# Altium footprint library ICs And Semiconductors THD.PcbLib: 350 footprints (part 22 of 22)
Each footprint in its own frame and in the unit in brackets; x right, y up, seen from the top. Pads: shape width x height; smd on the part's side, far side on the other; paste and mask are expansions set on the pad; w line width, h text height; cw(c..) or ccw(c..) is an arc to the next point about the centre after c.
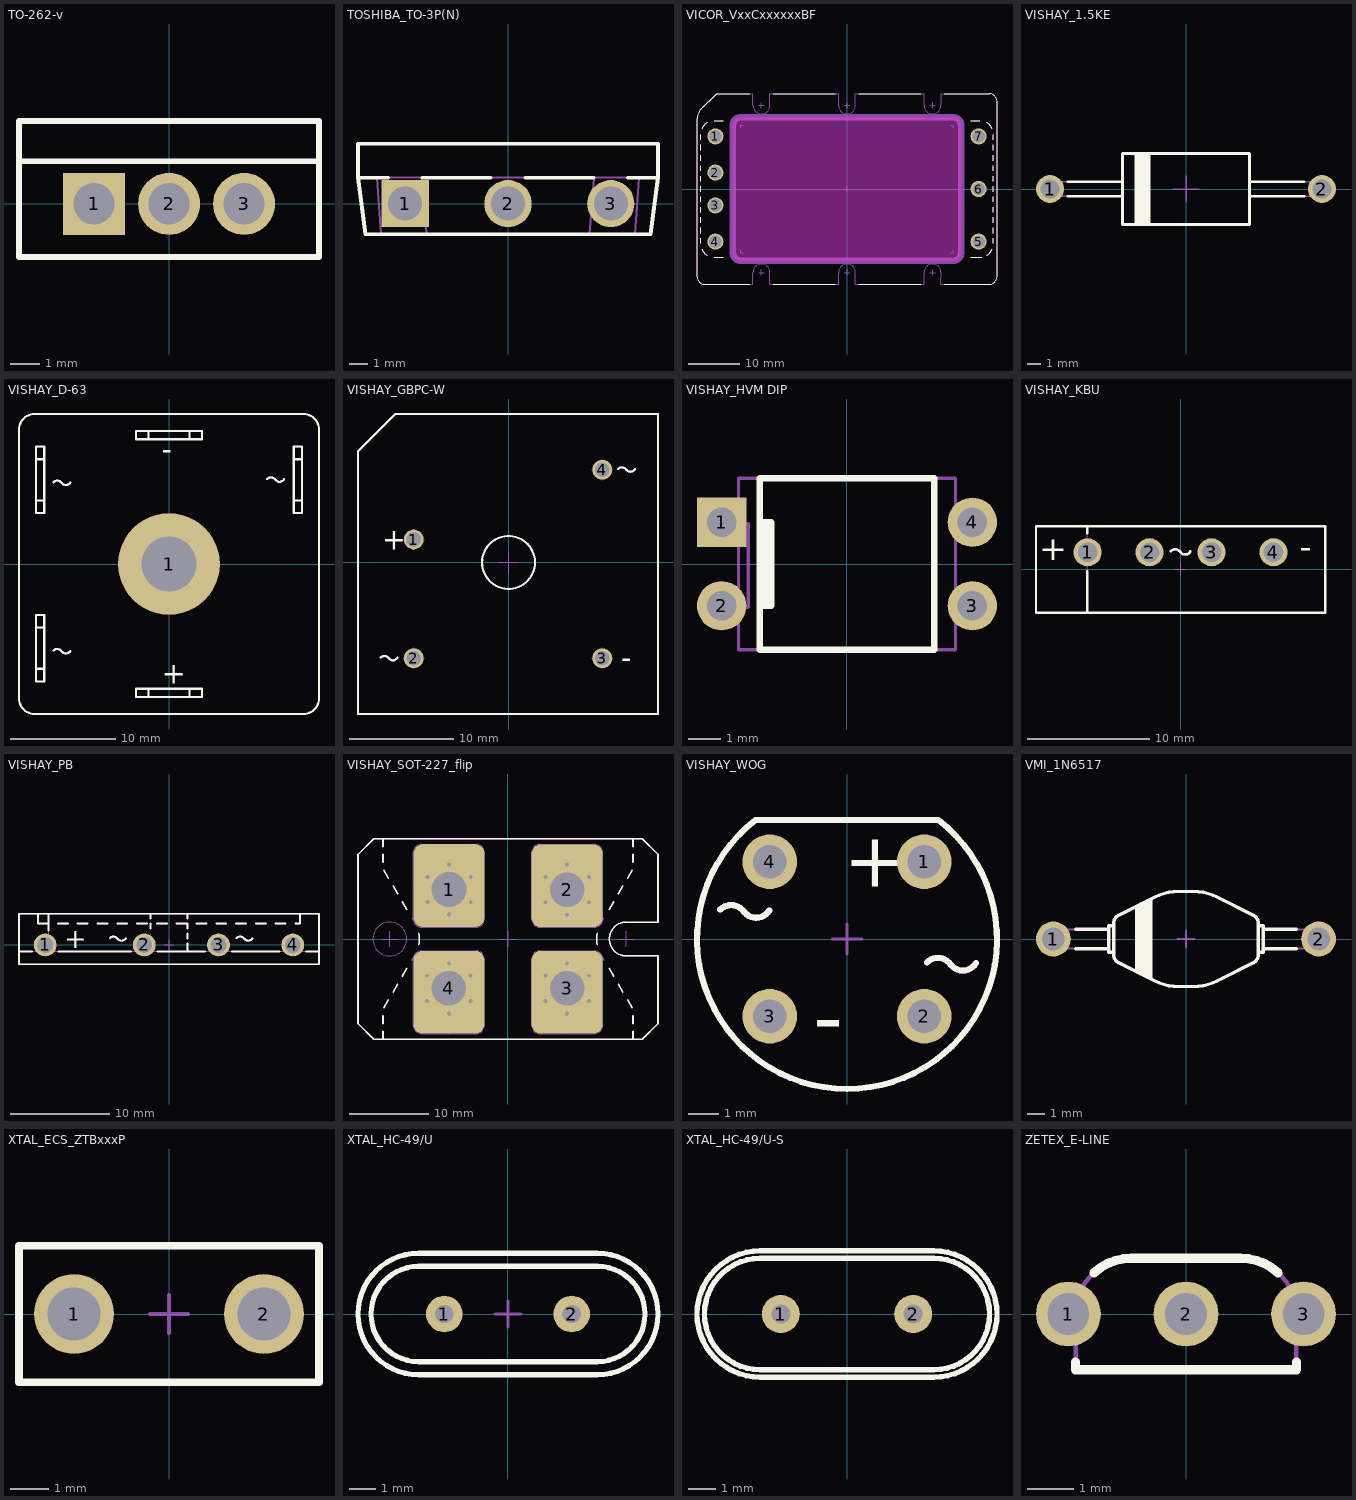
[diagram p21: the footprints below, top view; thin cyan lines are the x and y axes]

## TO-262-v [mm] "TO-262 3-Terminal - Vertical Mount"
height 15.01
pads (3):
  rect 2.1x2.1 hole 1.4: 1(-2.54,0)
  round 2.1 hole 1.4: 2(0,0) 3(2.54,0)
Top Overlay:
  lines w0.2: -5.082,1.445 5.078,1.445 ; -5.082,-1.795 5.078,-1.795 5.078,2.805 -5.082,2.805 -5.082,-1.795
Notvisible:
  lines w0.1: -3.04,0 -2.54,0 ; -2.54,-0.5 -2.54,0 ; -2.54,0.5 -2.54,0 ; -2.04,0 -2.54,0 ; -0.5,0 0,0 ; 0,-0.5 0,0 ; 0,0.5 0,0 ; 0.5,0 0,0 ; 2.04,0 2.54,0 ; 2.54,-0.5 2.54,0 ; 2.54,0.5 2.54,0 ; 3.04,0 2.54,0
Mechanical 14:
  lines w0.1: -5.082,1.445 5.078,1.445 ; -5.082,-1.795 5.078,-1.795 5.078,2.805 -5.082,2.805 -5.082,-1.795
3D body "TO-262-V.stp": height 15.3, standoff -3.6, extent -5.082,-1.795 5.078,2.805

## TOSHIBA_TO-3P(N) [mm] "TOSHIBA TO-3P(N) 3-Terminal - Vertical Mount"
height 25.5
pads (3):
  rect 2.5x2.5 hole 1.8: 1(-5.45,0)
  round 2.5 hole 1.8: 2(0,0) 3(5.45,0)
Top Overlay:
  lines w0.2: -6.362,1.375 -7.95,1.375 ; -4.538,1.375 -0.912,1.375 ; 0.912,1.375 4.538,1.375 ; 6.362,1.375 7.95,1.375 ; -7.95,1.375 -7.95,3.175 0,3.175 7.95,3.175 7.95,1.375 ; -7.95,1.375 -7.55,-1.625 0,-1.625 7.55,-1.625 7.95,1.375
Notvisible:
  lines w0.1: -6.45,0 -5.45,0 ; -5.45,-1 -5.45,0 ; -5.45,1 -5.45,0 ; -4.45,0 -5.45,0 ; -1,0 0,0 ; 0,-1 0,0 ; 0,1 0,0 ; 1,0 0,0 ; 4.45,0 5.45,0 ; 5.45,-1 5.45,0 ; 5.45,1 5.45,0 ; 6.45,0 5.45,0
Mechanical 14:
  lines w0.1: -6.95,1.375 -6.724,-1.625 ; -4.55,1.375 -4.324,-1.625 ; 4.324,-1.625 4.55,1.375 ; 6.724,-1.625 6.95,1.375 ; -7.95,1.375 -7.95,3.175 0,3.175 7.95,3.175 7.95,1.375 ; -7.95,1.375 -7.55,-1.625 0,-1.625 7.55,-1.625 7.95,1.375 ; -7.95,1.375 0,1.375 7.95,1.375
3D body "TOSHIBA_TO-3P(N)_v.stp": height 25.5, standoff -3.8, extent -7.95,-1.625 7.95,3.175

## VICOR_VxxCxxxxxxBF [mm] "VICOR  Micro DC-DC Converters, Short Pin RoHS, Slotted Baseplate"
height 12.7
pads (7):
  round 3.1 hole 2.4: 1(-25.4,10.16) 2(-25.4,3.175) 3(-25.4,-3.175) 4(-25.4,-10.16) 5(25.4,-10.16) 6(25.4,0) 7(25.4,10.16)
Top Overlay:
  lines w0.2: -28.194,-10.517 -28.194,-9.5 ; -28.194,-8.5 -28.194,-7.5 ; -28.194,-6.5 -28.194,-5.5 ; -28.194,-4.5 -28.194,-3.5 ; -28.194,-2.5 -28.194,-1.5 ; -28.194,-0.5 -28.194,0.5 ; -28.194,1.5 -28.194,2.5 ; -28.194,3.5 -28.194,4.5 ; -28.194,5.5 -28.194,6.5 ; -28.194,7.5 -28.194,8.5 ; -28.194,9.5 -28.194,10.517 ; -28,-11.642 ccw(c-25.655,-10.669) -27,-12.822 ; -28,11.642 cw(c-25.655,10.669) -27,12.822 ; -25.655,-13.208 -23.911,-13.208 ; -25.655,13.208 -23.911,13.208 ; -18.82,-18.415 -27.432,-18.415 cw(c-27.432,-16.891) -28.956,-16.891 -28.956,13.553 cw(c-26.416,13.553) -28.212,15.349 -25.146,18.415 -18.82,18.415 ; -14.2,-18.415 -2.31,-18.415 ; -14.2,18.415 -2.31,18.415 ; 2.31,-18.415 14.2,-18.415 ; 2.31,18.415 14.2,18.415 ; 18.82,-18.415 27.432,-18.415 ccw(c27.432,-16.891) 28.956,-16.891 28.956,16.891 ccw(c27.432,16.891) 27.432,18.415 18.82,18.415 ; 23.911,-13.208 25.655,-13.208 ccw(c25.655,-10.669) 26,-13.184 ; 23.911,13.208 25.655,13.208 ; 27,-12.822 ccw(c25.655,-10.669) 28,-11.642 ; 27,12.822 cw(c25.655,10.669) 28,11.642 ; 28.194,-10.517 28.194,-9.5 ; 28.194,-8.5 28.194,-7.5 ; 28.194,-6.5 28.194,-5.5 ; 28.194,-4.5 28.194,-3.5 ; 28.194,-2.5 28.194,-1.5 ; 28.194,-0.5 28.194,0.5 ; 28.194,1.5 28.194,2.5 ; 28.194,3.5 28.194,4.5 ; 28.194,5.5 28.194,6.5 ; 28.194,7.5 28.194,8.5 ; 28.194,9.5 28.194,10.517
Keep-Out Layer:
  board cut-out: -20.52,-13.836 -20.668,-13.836 -20.958,-13.778 -21.231,-13.665 -21.476,-13.501 -21.685,-13.292 -21.849,-13.046 -21.962,-12.773 -22.02,-12.483 -22.02,-12.336 -22.02,12.35 -22.02,12.498 -21.962,12.788 -21.849,13.061 -21.685,13.306 -21.476,13.515 -21.231,13.68 -20.958,13.793 -20.668,13.85 -20.52,13.85 20.52,13.85 20.668,13.85 20.958,13.793 21.231,13.68 21.476,13.515 21.685,13.306 21.849,13.061 21.962,12.788 22.02,12.498 22.02,12.35 22.02,-12.336 22.02,-12.483 21.962,-12.773 21.849,-13.046 21.685,-13.292 21.476,-13.501 21.231,-13.665 20.958,-13.778 20.668,-13.836 20.52,-13.836
Mechanical 1:
  lines w1.27: -22.02,-12.343 ccw(c-20.52,-12.343) -20.52,-13.843 20.52,-13.843 ccw(c20.52,-12.343) 22.02,-12.343 22.02,12.343 ccw(c20.52,12.343) 20.52,13.843 -20.52,13.843 ccw(c-20.52,12.343) -22.02,12.343 -22.02,-12.343
Notvisible:
  lines w0.1: -25.9,-10.16 -25.4,-10.16 ; -25.9,-3.175 -25.4,-3.175 ; -25.9,3.175 -25.4,3.175 ; -25.9,10.16 -25.4,10.16 ; -25.4,-10.66 -25.4,-10.16 ; -25.4,-9.66 -25.4,-10.16 ; -25.4,-3.675 -25.4,-3.175 ; -25.4,-2.675 -25.4,-3.175 ; -25.4,2.675 -25.4,3.175 ; -25.4,3.675 -25.4,3.175 ; -25.4,9.66 -25.4,10.16 ; -25.4,10.66 -25.4,10.16 ; -24.9,-10.16 -25.4,-10.16 ; -24.9,-3.175 -25.4,-3.175 ; -24.9,3.175 -25.4,3.175 ; -24.9,10.16 -25.4,10.16 ; -20.52,-11.843 -20.52,-12.343 -20.02,-12.343 ; -20.52,11.843 -20.52,12.343 -20.02,12.343 ; -17.01,-16.129 -16.51,-16.129 ; -17.01,16.129 -16.51,16.129 ; -16.51,-16.629 -16.51,-16.129 ; -16.51,-15.629 -16.51,-16.129 ; -16.51,15.629 -16.51,16.129 ; -16.51,16.629 -16.51,16.129 ; -16.01,-16.129 -16.51,-16.129 ; -16.01,16.129 -16.51,16.129 ; -0.5,-16.129 0,-16.129 ; -0.5,0 0,0 ; -0.5,16.129 0,16.129 ; 0,-16.629 0,-16.129 ; 0,-15.629 0,-16.129 ; 0,-0.5 0,0 ; 0,0.5 0,0 ; 0,15.629 0,16.129 ; 0,16.629 0,16.129 ; 0.5,-16.129 0,-16.129 ; 0.5,0 0,0 ; 0.5,16.129 0,16.129 ; 16.01,-16.129 16.51,-16.129 ; 16.01,16.129 16.51,16.129 ; 16.51,-16.629 16.51,-16.129 ; 16.51,-15.629 16.51,-16.129 ; 16.51,15.629 16.51,16.129 ; 16.51,16.629 16.51,16.129 ; 17.01,-16.129 16.51,-16.129 ; 17.01,16.129 16.51,16.129 ; 20.02,-12.343 20.52,-12.343 20.52,-11.843 ; 20.02,12.343 20.52,12.343 20.52,11.843 ; 24.9,-10.16 25.4,-10.16 ; 24.9,0 25.4,0 ; 24.9,10.16 25.4,10.16 ; 25.4,-10.66 25.4,-10.16 ; 25.4,-9.66 25.4,-10.16 ; 25.4,-0.5 25.4,0 ; 25.4,0.5 25.4,0 ; 25.4,9.66 25.4,10.16 ; 25.4,10.66 25.4,10.16 ; 25.9,-10.16 25.4,-10.16 ; 25.9,0 25.4,0 ; 25.9,10.16 25.4,10.16 ; -22.02,-12.343 ccw(c-20.52,-12.343) -20.52,-13.843 20.52,-13.843 ccw(c20.52,-12.343) 22.02,-12.343 22.02,12.343 ccw(c20.52,12.343) 20.52,13.843 -20.52,13.843 ccw(c-20.52,12.343) -22.02,12.343 -22.02,-12.343
Mechanical 14:
  lines w0.1: -28.956,-16.891 -28.956,13.553 ; -28.212,15.349 -25.146,18.415 -18.148,18.415 -18.148,16.129 ccw(c-16.51,16.129) -14.872,16.129 -14.872,18.415 -1.638,18.415 -1.638,16.129 ccw(c0,16.129) 1.638,16.129 1.638,18.415 14.872,18.415 14.872,16.129 ccw(c16.51,16.129) 18.148,16.129 18.148,18.415 27.432,18.415 ; -28.194,-10.517 -28.194,-9.5 ; -28.194,-8.5 -28.194,-7.5 ; -28.194,-6.5 -28.194,-5.5 ; -28.194,-4.5 -28.194,-3.5 ; -28.194,-2.5 -28.194,-1.5 ; -28.194,-0.5 -28.194,0.5 ; -28.194,1.5 -28.194,2.5 ; -28.194,3.5 -28.194,4.5 ; -28.194,5.5 -28.194,6.5 ; -28.194,7.5 -28.194,8.5 ; -28.194,9.5 -28.194,10.517 ; -28,-11.642 ccw(c-25.655,-10.669) -27,-12.822 ; -28,11.642 cw(c-25.655,10.669) -27,12.822 ; -27.432,-18.415 -18.148,-18.415 -18.148,-16.129 cw(c-16.51,-16.129) -14.872,-16.129 -14.872,-18.415 -1.638,-18.415 -1.638,-16.129 cw(c0,-16.129) 1.638,-16.129 1.638,-18.415 14.872,-18.415 14.872,-16.129 cw(c16.51,-16.129) 18.148,-16.129 18.134,-18.415 27.432,-18.415 ; -25.655,-13.208 -23.911,-13.208 ; -25.655,13.208 -23.911,13.208 ; 23.911,-13.208 25.655,-13.208 ccw(c25.655,-10.669) 26,-13.184 ; 23.911,13.208 25.655,13.208 ; 27,-12.822 ccw(c25.655,-10.669) 28,-11.642 ; 27,12.822 cw(c25.655,10.669) 28,11.642 ; 28.194,-10.517 28.194,-9.5 ; 28.194,-8.5 28.194,-7.5 ; 28.194,-6.5 28.194,-5.5 ; 28.194,-4.5 28.194,-3.5 ; 28.194,-2.5 28.194,-1.5 ; 28.194,-0.5 28.194,0.5 ; 28.194,1.5 28.194,2.5 ; 28.194,3.5 28.194,4.5 ; 28.194,5.5 28.194,6.5 ; 28.194,7.5 28.194,8.5 ; 28.194,9.5 28.194,10.517 ; 28.956,-16.891 28.956,16.891
3D body "VICOR_VxxCxxxxxxBF.stp": height 10.9, standoff -2.88, extent -28.956,-18.415 28.956,18.415

## VISHAY_1.5KE [mm] "VISHAY 1.5KE Case Style, Diode, Axial; Lead Spacing 20.32mm, Lead Dia. 1.07mm, Body Length 9.5mm, Body Dia. 5.3mm"
height 5.3
pads (2):
  round 2.1 hole 1.4: 1(-10.16,0) 2(10.16,0)
Top Overlay:
  lines w0.2: -8.812,-0.535 -4.75,-0.535 ; -8.812,0.535 -4.75,0.535 ; -3.75,-2.65 -3.75,2.65 ; -3.55,-2.65 -3.55,2.65 ; -3.35,-2.65 -3.35,2.65 ; -3.15,-2.65 -3.15,2.65 ; -2.95,-2.65 -2.95,2.65 ; -2.75,-2.65 -2.75,2.65 ; 4.75,-0.535 8.812,-0.535 ; 4.75,0.535 8.812,0.535 ; -4.75,-2.65 -4.75,2.65 4.75,2.65 4.75,-2.65 -4.75,-2.65
Notvisible:
  lines w0.1: -11.16,0 -10.16,0 ; -10.16,-1 -10.16,0 ; -10.16,1 -10.16,0 ; -9.16,0 -10.16,0 ; -1,0 0,0 ; 0,-1 0,0 ; 0,1 0,0 ; 1,0 0,0 ; 9.16,0 10.16,0 ; 10.16,-1 10.16,0 ; 10.16,1 10.16,0 ; 11.16,0 10.16,0
Mechanical 14:
  lines w0.1: -4.75,-0.535 -10.16,-0.535 cw(c-10.16,0) -10.16,0.535 -4.75,0.535 ; -3.75,-2.65 -3.75,2.65 ; -3.55,-2.65 -3.55,2.65 ; -3.35,-2.65 -3.35,2.65 ; -3.15,-2.65 -3.15,2.65 ; -2.95,-2.65 -2.95,2.65 ; -2.75,-2.65 -2.75,2.65 ; 4.75,-0.535 10.16,-0.535 ccw(c10.16,0) 10.16,0.535 4.75,0.535 ; -4.75,-2.65 -4.75,2.65 4.75,2.65 4.75,-2.65 -4.75,-2.65
3D body "VISHAY_1.5KE.stp": height 5.3, standoff -3.8, extent -10.695,-2.65 10.695,2.65

## VISHAY_D-63 [mm] "Three Phase Bridge Bridge, Body 28.5mm x 28.5mm"
height 10
pads (1):
  round 9.65 hole 5.2: 1(0,0)
Top Overlay:
  lines w0.2: -12.65,-9.95 -11.85,-9.95 ; -12.65,-6.05 -11.85,-6.05 ; -12.65,6.05 -11.85,6.05 ; -12.65,9.95 -11.85,9.95 ; -10.975,-8.232 cw(c-10.615,-8.579) -10.2,-8.3 ; -10.975,7.768 cw(c-10.615,7.421) -10.2,7.7 ; -10.175,-8.32 ccw(c-9.794,-7.996) -9.365,-8.254 ; -10.175,7.68 ccw(c-9.794,8.004) -9.365,7.746 ; -1.95,-12.65 -1.95,-11.85 ; -1.95,11.85 -1.95,12.65 ; 1.95,-12.65 1.95,-11.85 ; 1.95,11.85 1.95,12.65 ; 9.325,8.068 cw(c9.685,7.721) 10.1,8 ; 10.125,7.98 ccw(c10.506,8.304) 10.935,8.046 ; 11.85,6.05 12.65,6.05 ; 11.85,9.95 12.65,9.95 ; -14.25,-12.75 ccw(c-12.75,-12.75) -12.75,-14.25 12.75,-14.25 ccw(c12.75,-12.75) 14.25,-12.75 14.25,12.75 ccw(c12.75,12.75) 12.75,14.25 -12.75,14.25 ccw(c-12.75,12.75) -14.25,12.75 -14.25,-12.75 ; -12.65,-11.15 -12.65,-4.85 -11.85,-4.85 -11.85,-11.15 -12.65,-11.15 ; -12.65,4.85 -12.65,11.15 -11.85,11.15 -11.85,4.85 -12.65,4.85 ; -3.15,-12.65 3.15,-12.65 3.15,-11.85 -3.15,-11.85 -3.15,-12.65 ; -3.15,11.85 3.15,11.85 3.15,12.65 -3.15,12.65 -3.15,11.85 ; 11.85,4.85 11.85,11.15 12.65,11.15 12.65,4.85 11.85,4.85
  text "+" at -0.7,-11.4 h2
  text "-" at -0.7,9.9 h2
Notvisible:
  lines w0.1: -1,0 0,0 ; 0,-1 0,0 ; 0,1 0,0 ; 1,0 0,0
Mechanical 14:
  circle w0.1: c0,0 r2.6
  lines w0.1: -14.25,-12.75 ccw(c-12.75,-12.75) -12.75,-14.25 ; -14.25,-12.75 ccw(c-12.75,-12.75) -12.75,-14.25 ; -14.25,-12.75 ccw(c-12.75,-12.75) -12.75,-14.25 ; -14.25,-12.75 -14.25,12.75 ; -14.25,-12.75 -14.25,12.75 ; -14.25,-12.75 -14.25,12.75 ; -14.25,12.75 cw(c-12.75,12.75) -12.75,14.25 ; -14.25,12.75 cw(c-12.75,12.75) -12.75,14.25 ; -14.25,12.75 cw(c-12.75,12.75) -12.75,14.25 ; -12.75,-14.25 12.75,-14.25 ; -12.75,-14.25 12.75,-14.25 ; -12.75,-14.25 12.75,-14.25 ; -12.75,14.25 12.75,14.25 ; -12.75,14.25 12.75,14.25 ; -12.75,14.25 12.75,14.25 ; -12.65,-11.15 -12.65,-4.85 ; -12.65,-11.15 -11.85,-11.15 ; -12.65,-11.15 -11.85,-11.15 ; -12.65,-11.15 -12.65,-4.85 ; -12.65,-11.15 -12.65,-4.85 ; -12.65,-11.15 -11.85,-11.15 ; -12.65,-9.95 -11.85,-9.95 ; -12.65,-9.95 -11.85,-9.95 ; -12.65,-9.95 -11.85,-9.95 ; -12.65,-6.05 -11.85,-6.05 ; -12.65,-6.05 -11.85,-6.05 ; -12.65,-6.05 -11.85,-6.05 ; -12.65,-4.85 -11.85,-4.85 ; -12.65,-4.85 -11.85,-4.85 ; -12.65,-4.85 -11.85,-4.85 ; -12.65,4.85 -12.65,11.15 ; -12.65,4.85 -11.85,4.85 ; -12.65,4.85 -11.85,4.85 ; -12.65,4.85 -12.65,11.15 ; -12.65,4.85 -12.65,11.15 ; -12.65,4.85 -11.85,4.85 ; -12.65,6.05 -11.85,6.05 ; -12.65,6.05 -11.85,6.05 ; -12.65,6.05 -11.85,6.05 ; -12.65,9.95 -11.85,9.95 ; -12.65,9.95 -11.85,9.95 ; -12.65,9.95 -11.85,9.95 ; -12.65,11.15 -11.85,11.15 ; -12.65,11.15 -11.85,11.15 ; -12.65,11.15 -11.85,11.15 ; -11.85,-11.15 -11.85,-4.85 ; -11.85,-11.15 -11.85,-4.85 ; -11.85,-11.15 -11.85,-4.85 ; -11.85,4.85 -11.85,11.15 ; -11.85,4.85 -11.85,11.15 ; -11.85,4.85 -11.85,11.15 ; -3.15,-12.65 3.15,-12.65 ; -3.15,-12.65 -3.15,-11.85 ; -3.15,-12.65 -3.15,-11.85 ; -3.15,-12.65 3.15,-12.65 ; -3.15,-12.65 3.15,-12.65 ; -3.15,-12.65 -3.15,-11.85 ; -3.15,-11.85 3.15,-11.85 ; -3.15,-11.85 3.15,-11.85 ; -3.15,-11.85 3.15,-11.85 ; -3.15,11.85 3.15,11.85 ; -3.15,11.85 -3.15,12.65 ; -3.15,11.85 -3.15,12.65 ; -3.15,11.85 3.15,11.85 ; -3.15,11.85 3.15,11.85 ; -3.15,11.85 -3.15,12.65 ; -3.15,12.65 3.15,12.65 ; -3.15,12.65 3.15,12.65 ; -3.15,12.65 3.15,12.65 ; -1.95,-12.65 -1.95,-11.85 ; -1.95,-12.65 -1.95,-11.85 ; -1.95,-12.65 -1.95,-11.85 ; -1.95,11.85 -1.95,12.65 ; -1.95,11.85 -1.95,12.65 ; -1.95,11.85 -1.95,12.65 ; 1.95,-12.65 1.95,-11.85 ; 1.95,-12.65 1.95,-11.85 ; 1.95,-12.65 1.95,-11.85 ; 1.95,11.85 1.95,12.65 ; 1.95,11.85 1.95,12.65 ; 1.95,11.85 1.95,12.65 ; 3.15,-12.65 3.15,-11.85 ; 3.15,-12.65 3.15,-11.85 ; 3.15,-12.65 3.15,-11.85 ; 3.15,11.85 3.15,12.65 ; 3.15,11.85 3.15,12.65 ; 3.15,11.85 3.15,12.65 ; 11.85,4.85 11.85,11.15 ; 11.85,4.85 12.65,4.85 ; 11.85,4.85 12.65,4.85 ; 11.85,4.85 11.85,11.15 ; 11.85,4.85 11.85,11.15 ; 11.85,4.85 12.65,4.85 ; 11.85,6.05 12.65,6.05 ; 11.85,6.05 12.65,6.05 ; 11.85,6.05 12.65,6.05 ; 11.85,9.95 12.65,9.95 ; 11.85,9.95 12.65,9.95 ; 11.85,9.95 12.65,9.95 ; 11.85,11.15 12.65,11.15 ; 11.85,11.15 12.65,11.15 ; 11.85,11.15 12.65,11.15 ; 12.65,4.85 12.65,11.15 ; 12.65,4.85 12.65,11.15 ; 12.65,4.85 12.65,11.15 ; 12.75,-14.25 ccw(c12.75,-12.75) 14.25,-12.75 ; 12.75,-14.25 ccw(c12.75,-12.75) 14.25,-12.75 ; 12.75,-14.25 ccw(c12.75,-12.75) 14.25,-12.75 ; 12.75,14.25 cw(c12.75,12.75) 14.25,12.75 ; 12.75,14.25 cw(c12.75,12.75) 14.25,12.75 ; 12.75,14.25 cw(c12.75,12.75) 14.25,12.75 ; 14.25,-12.75 14.25,12.75 ; 14.25,-12.75 14.25,12.75 ; 14.25,-12.75 14.25,12.75
  lines w0.2: -10.975,-8.232 cw(c-10.615,-8.579) -10.2,-8.3 ; -10.975,-8.232 cw(c-10.615,-8.579) -10.2,-8.3 ; -10.975,-8.232 cw(c-10.615,-8.579) -10.2,-8.3 ; -10.975,7.768 cw(c-10.615,7.421) -10.2,7.7 ; -10.975,7.768 cw(c-10.615,7.421) -10.2,7.7 ; -10.975,7.768 cw(c-10.615,7.421) -10.2,7.7 ; -10.175,-8.32 ccw(c-9.794,-7.996) -9.365,-8.254 ; -10.175,-8.32 ccw(c-9.794,-7.996) -9.365,-8.254 ; -10.175,-8.32 ccw(c-9.794,-7.996) -9.365,-8.254 ; -10.175,7.68 ccw(c-9.794,8.004) -9.365,7.746 ; -10.175,7.68 ccw(c-9.794,8.004) -9.365,7.746 ; -10.175,7.68 ccw(c-9.794,8.004) -9.365,7.746 ; 9.325,8.068 cw(c9.685,7.721) 10.1,8 ; 9.325,8.068 cw(c9.685,7.721) 10.1,8 ; 9.325,8.068 cw(c9.685,7.721) 10.1,8 ; 10.125,7.98 ccw(c10.506,8.304) 10.935,8.046 ; 10.125,7.98 ccw(c10.506,8.304) 10.935,8.046 ; 10.125,7.98 ccw(c10.506,8.304) 10.935,8.046
  text "+" at -0.7,-11.4 h2
  text "-" at -0.7,9.9 h2
  text "-" at -0.7,9.9 h2
  text "+" at -0.7,-11.4 h2
  text "+" at -0.7,-11.4 h2
  text "-" at -0.7,9.9 h2
3D body "VISHAY_D-63.stp": height 21, standoff 0, extent -14.25,-14.25 14.25,14.25

## VISHAY_GBPC-W [mm] "Glass Passivated Single-Phase Bridge Rectifier, Body 28.8mm x 28.8mm"
height 7.62
pads (4):
  round 1.9 hole 1.4: 1(-9.1,2.2) 2(-9.1,-9.2) 3(9,-9.2) 4(9,8.9)
Top Overlay:
  circle w0.2: c0,0 r2.54
  lines w0.2: -12.275,-9.132 cw(c-11.915,-9.479) -11.5,-9.2 ; -11.475,-9.22 ccw(c-11.094,-8.896) -10.665,-9.154 ; 10.525,8.968 cw(c10.885,8.621) 11.3,8.9 ; 11.325,8.88 ccw(c11.706,9.204) 12.135,8.946 ; -14.45,-14.55 -14.45,10.664 -10.864,14.25 14.35,14.25 14.35,-14.55 -14.45,-14.55
  text "+" at -12.1,1.2 h2
  text "-" at 10.8,-10.1 h2
Notvisible:
  lines w0.1: -10.1,-9.2 -9.1,-9.2 ; -10.1,2.2 -9.1,2.2 ; -9.1,-10.2 -9.1,-9.2 ; -9.1,-8.2 -9.1,-9.2 ; -9.1,1.2 -9.1,2.2 ; -9.1,3.2 -9.1,2.2 ; -8.1,-9.2 -9.1,-9.2 ; -8.1,2.2 -9.1,2.2 ; -1,0 0,0 ; 0,-1 0,0 ; 0,1 0,0 ; 1,0 0,0 ; 8,-9.2 9,-9.2 ; 8,8.9 9,8.9 ; 9,-10.2 9,-9.2 ; 9,-8.2 9,-9.2 ; 9,7.9 9,8.9 ; 9,9.9 9,8.9 ; 10,-9.2 9,-9.2 ; 10,8.9 9,8.9
Mechanical 14:
  circle w0.1: c0,0 r2.54
  lines w0.1: -14.45,-14.55 -14.45,10.664 -10.864,14.25 14.35,14.25 14.35,-14.55 -14.45,-14.55
  lines w0.2: -12.275,-9.132 cw(c-11.915,-9.479) -11.5,-9.2 ; -11.475,-9.22 ccw(c-11.094,-8.896) -10.665,-9.154 ; 10.525,8.968 cw(c10.885,8.621) 11.3,8.9 ; 11.325,8.88 ccw(c11.706,9.204) 12.135,8.946
  text "+" at -12.1,1.2 h2
  text "-" at 10.8,-10.1 h2
3D body "VISHAY_GBPC-W.stp": height 7.62, standoff -3.4, extent -14.45,-14.55 14.35,14.25

## VISHAY_HVM DIP [mm] "DIP 4 Leads, Row Spacing 7.62 mm; Pitch 2.54 mm"
height 4.57
pads (4):
  rect 1.5x1.5 hole 0.9: 1(-3.81,1.27)
  round 1.5 hole 0.9: 2(-3.81,-1.27) 3(3.81,-1.27) 4(3.81,1.27)
Top Overlay:
  lines w0.2: -2.4,-1.275 -2.4,1.265 ; -2.3,-1.275 -2.3,1.265 ; -2.3,-1.27 -2.51,-1.27 -2.51,1.27 -2.3,1.27 ; -2.65,-2.61 -2.65,2.61 2.65,2.61 2.65,-2.61 -2.65,-2.61
Mechanical 14:
  lines w0.1: -3.3,-1.315 -3,-1.315 -3,1.225 -3.3,1.225 ; -3.3,-2.61 3.3,-2.61 3.3,2.61 -3.3,2.61 -3.3,-2.61
3D body "VISHAY_HVM DIP.stp": height 4.57, standoff -3.3, extent -3.935,-2.54 3.935,2.54

## VISHAY_KBU [mm] "Single-Phase Bridge Rectifier, Body 23.2mm x 6.85mm"
height 19.3
pads (4):
  round 2.3 hole 1.6: 1(-7.62,1.4) 2(-2.54,1.4) 3(2.54,1.4) 4(7.62,1.4)
Top Overlay:
  lines w0.2: -7.65,-3.55 -7.65,-0.15 ; -7.65,2.95 -7.65,3.55 ; -0.8,1.488 cw(c-0.44,1.141) -0.025,1.42 ; 0,1.4 ccw(c0.381,1.723) 0.81,1.466 ; -11.85,-3.55 -11.85,3.55 11.85,3.55 11.85,-3.55 -11.85,-3.55
  text "-" at 10.745,2.4 h2
  text "+" at -9.27,2.425 h2
Notvisible:
  lines w0.1: -8.12,1.4 -7.62,1.4 ; -7.62,0.9 -7.62,1.4 ; -7.62,1.9 -7.62,1.4 ; -7.12,1.4 -7.62,1.4 ; -3.04,1.4 -2.54,1.4 ; -2.54,0.9 -2.54,1.4 ; -2.54,1.9 -2.54,1.4 ; -2.04,1.4 -2.54,1.4 ; -0.5,0 0,0 ; 0,-0.5 0,0 ; 0,0.5 0,0 ; 0.5,0 0,0 ; 2.04,1.4 2.54,1.4 ; 2.54,0.9 2.54,1.4 ; 2.54,1.9 2.54,1.4 ; 3.04,1.4 2.54,1.4 ; 7.12,1.4 7.62,1.4 ; 7.62,0.9 7.62,1.4 ; 7.62,1.9 7.62,1.4 ; 8.12,1.4 7.62,1.4
Mechanical 14:
  lines w0.1: -7.65,-3.55 -7.65,3.55 ; -11.85,-3.55 -11.85,3.55 11.85,3.55 11.85,-3.55 -11.85,-3.55
  lines w0.2: -0.8,1.488 cw(c-0.44,1.141) -0.025,1.42 ; 0,1.4 ccw(c0.381,1.723) 0.81,1.466
  text "-" at 10.745,2.4 h2
  text "+" at -9.27,2.425 h2
3D body "VISHAY_KBU.stp": height 19.29, standoff -3.8, extent -11.85,-3.55 11.85,3.55

## VISHAY_PB [mm] "Bridge Rectifier, Body 30mm x 4.8mm, VISHAY Case Type PB"
height 24.45
pads (4):
  round 2.3 hole 1.6: 1(-12.5,0) 2(-2.5,0) 3(5,0) 4(12.5,0)
Top Overlay:
  lines w0.2: -15.15,-0.65 -13.852,-0.65 ; -13.22,3.15 -13.22,2.15 -12.22,2.15 ; -12.15,1.459 -12.15,3.15 ; -11.22,2.15 -10.22,2.15 ; -11.148,-0.65 -3.852,-0.65 ; -9.22,2.15 -8.22,2.15 ; -7.22,2.15 -6.22,2.15 ; -5.975,0.688 cw(c-5.615,0.341) -5.2,0.62 ; -5.22,2.15 -4.22,2.15 ; -5.175,0.6 ccw(c-4.794,0.923) -4.365,0.666 ; -3.22,2.15 -2.22,2.15 ; -1.85,1.65 -1.85,2.15 ; -1.85,2.65 -1.85,3.15 ; -1.22,2.15 -0.22,2.15 ; -1.148,-0.65 3.648,-0.65 ; 0.78,2.15 1.78,2.15 ; 1.85,-0.65 1.85,0.15 ; 1.85,0.65 1.85,1.15 ; 1.85,1.65 1.85,2.15 ; 1.85,2.65 1.85,3.15 ; 2.78,2.15 3.78,2.15 ; 4.78,2.15 5.78,2.15 ; 6.352,-0.65 11.148,-0.65 ; 6.78,2.15 7.78,2.15 ; 6.825,0.688 cw(c7.185,0.341) 7.6,0.62 ; 7.625,0.6 ccw(c8.006,0.923) 8.435,0.666 ; 8.78,2.15 9.78,2.15 ; 10.78,2.15 11.78,2.15 ; 12.78,2.15 13.22,2.15 13.22,3.15 ; 13.852,-0.65 15.15,-0.65 ; -15.15,-1.95 -15.15,3.15 0,3.15 15.15,3.15 15.15,-1.95 -15.15,-1.95
  text "+" at -10.575,-0.355 h2
Notvisible:
  lines w0.1: -13,0 -12.5,0 ; -12.5,-0.5 -12.5,0 ; -12.5,0.5 -12.5,0 ; -12,0 -12.5,0 ; -3,0 -2.5,0 ; -2.5,-0.5 -2.5,0 ; -2.5,0.5 -2.5,0 ; -2,0 -2.5,0 ; -0.5,0 0,0 ; 0,-0.5 0,0 ; 0,0.5 0,0 ; 0.5,0 0,0 ; 4.5,0 5,0 ; 5,-0.5 5,0 ; 5,0.5 5,0 ; 5.5,0 5,0 ; 12,0 12.5,0 ; 12.5,-0.5 12.5,0 ; 12.5,0.5 12.5,0 ; 13,0 12.5,0
Mechanical 14:
  lines w0.1: -15.15,-0.65 15.15,-0.65 ; -13.22,3.15 -13.22,2.15 -12.22,2.15 ; -12.15,-0.65 -12.15,3.15 ; -11.22,2.15 -10.22,2.15 ; -9.22,2.15 -8.22,2.15 ; -7.22,2.15 -6.22,2.15 ; -5.22,2.15 -4.22,2.15 ; -3.22,2.15 -2.22,2.15 ; -1.85,-0.65 -1.85,0.15 ; -1.85,0.65 -1.85,1.15 ; -1.85,1.65 -1.85,2.15 ; -1.85,2.65 -1.85,3.15 ; -1.22,2.15 -0.22,2.15 ; 0.78,2.15 1.78,2.15 ; 1.85,-0.65 1.85,0.15 ; 1.85,0.65 1.85,1.15 ; 1.85,1.65 1.85,2.15 ; 1.85,2.65 1.85,3.15 ; 2.78,2.15 3.78,2.15 ; 4.78,2.15 5.78,2.15 ; 6.78,2.15 7.78,2.15 ; 8.78,2.15 9.78,2.15 ; 10.78,2.15 11.78,2.15 ; 12.78,2.15 13.22,2.15 13.22,3.15 ; -15.15,-1.95 -15.15,3.15 0,3.15 15.15,3.15 15.15,-1.95 -15.15,-1.95
  lines w0.2: -5.975,0.688 cw(c-5.615,0.341) -5.2,0.62 ; -5.175,0.6 ccw(c-4.794,0.923) -4.365,0.666 ; 6.825,0.688 cw(c7.185,0.341) 7.6,0.62 ; 7.625,0.6 ccw(c8.006,0.923) 8.435,0.666
  text "+" at -10.575,-0.355 h2
3D body "VISHAY_PB.stp": height 29.3, standoff -4, extent -15.15,-1.95 15.15,3.15

## VISHAY_SOT-227_flip [mm] "VISHAY SOT-227 Case, Body 38.3mm x 25.7mm, Screws on PCB Version"
height 5.6
pads (4):
  rrect25% 9x10.5 hole 4.4 copper offset 0,0.5: 1(-7.475,6.275) 2(7.5,6.25)
  rrect25% 9x10.5 hole 4.4 copper offset 0,-0.5: 3(7.5,-6.25) 4(-7.5,-6.25)
via 4.75,-4.663 diameter 1 hole 0.5
via 7.5,-3.075 diameter 1 hole 0.5
via 10.25,-4.663 diameter 1 hole 0.5
via 10.25,-7.838 diameter 1 hole 0.5
via 7.5,-9.425 diameter 1 hole 0.5
via 4.75,-7.838 diameter 1 hole 0.5
via -10.25,-4.663 diameter 1 hole 0.5
via -7.5,-3.075 diameter 1 hole 0.5
via -4.75,-4.663 diameter 1 hole 0.5
via -4.75,-7.838 diameter 1 hole 0.5
via -7.5,-9.425 diameter 1 hole 0.5
via -10.25,-7.838 diameter 1 hole 0.5
via -4.725,4.687 diameter 1 hole 0.5
via -7.475,3.1 diameter 1 hole 0.5
via -10.225,4.687 diameter 1 hole 0.5
via -10.225,7.862 diameter 1 hole 0.5
via -7.475,9.45 diameter 1 hole 0.5
via -4.725,7.862 diameter 1 hole 0.5
via 10.25,7.838 diameter 1 hole 0.5
via 7.5,9.425 diameter 1 hole 0.5
via 4.75,7.838 diameter 1 hole 0.5
via 4.75,4.663 diameter 1 hole 0.5
via 7.5,3.075 diameter 1 hole 0.5
via 10.25,4.663 diameter 1 hole 0.5
Top Overlay:
  lines w0.2: -15.85,-12.725 -15.85,-11.725 ; -15.85,-10.725 -15.85,-9.725 ; -15.85,9.725 -15.85,10.725 ; -15.85,11.725 -15.85,12.725 ; -15.747,-8.725 -15.162,-7.725 ; -15.747,8.725 -15.162,7.725 ; -14.576,-6.725 -13.991,-5.725 ; -14.576,6.725 -13.991,5.725 ; -13.405,-4.725 -12.82,-3.725 ; -13.405,4.725 -12.82,3.725 ; -11.316,-0.725 ccw(c-15.073,0) -11.316,0.725 ; 11.319,-0.725 cw(c15.1,0) 11.319,0.725 ; 12.82,-3.725 13.405,-4.725 ; 12.82,3.725 13.405,4.725 ; 13.991,-5.725 14.576,-6.725 ; 13.991,5.725 14.576,6.725 ; 15.162,-7.725 15.748,-8.725 ; 15.162,7.725 15.748,8.725 ; 15.85,-12.725 15.85,-11.725 ; 15.85,-10.725 15.85,-9.725 ; 15.85,9.725 15.85,10.725 ; 15.85,11.725 15.85,12.725 ; -19.025,-10.725 -19.025,10.725 -17.025,12.725 17.025,12.725 19.025,10.725 19.025,2.15 15,2.15 ccw(c15,0) 15,-2.15 19.025,-2.15 19.025,-10.725 17.025,-12.725 -17.025,-12.725 -19.025,-10.725
Notvisible:
  lines w0.1: -16,0 -15,0 ; -15,-1 -15,0 ; -15,1 -15,0 ; -14,0 -15,0 ; -12,-6.75 -7.5,-6.75 ; -12,6.75 -7.5,6.75 ; -8.207,-6.957 -7.5,-6.25 ; -8.207,-5.543 -7.5,-6.25 ; -8.207,5.543 -7.5,6.25 ; -8.207,6.957 -7.5,6.25 ; -7.5,-12 -7.5,-6.75 ; -7.5,-1.5 -7.5,-6.75 ; -7.5,1.5 -7.5,6.75 ; -7.5,12 -7.5,6.75 ; -6.793,-6.957 -7.5,-6.25 ; -6.793,-5.543 -7.5,-6.25 ; -6.793,5.543 -7.5,6.25 ; -6.793,6.957 -7.5,6.25 ; -3,-6.75 -7.5,-6.75 ; -3,6.75 -7.5,6.75 ; -1,0 0,0 ; 0,-1 0,0 ; 0,1 0,0 ; 1,0 0,0 ; 3,-6.75 7.5,-6.75 ; 3,6.75 7.5,6.75 ; 6.793,-6.957 7.5,-6.25 ; 6.793,-5.543 7.5,-6.25 ; 6.793,5.543 7.5,6.25 ; 6.793,6.957 7.5,6.25 ; 7.5,-12 7.5,-6.75 ; 7.5,-1.5 7.5,-6.75 ; 7.5,1.5 7.5,6.75 ; 7.5,12 7.5,6.75 ; 8.207,-6.957 7.5,-6.25 ; 8.207,-5.543 7.5,-6.25 ; 8.207,5.543 7.5,6.25 ; 8.207,6.957 7.5,6.25 ; 12,-6.75 7.5,-6.75 ; 12,6.75 7.5,6.75 ; 14,0 15,0 ; 15,-1 15,0 ; 15,1 15,0 ; 16,0 15,0 ; -12,-11 ccw(c-11,-11) -11,-12 -4,-12 ccw(c-4,-11) -3,-11 -3,-2.5 ccw(c-4,-2.5) -4,-1.5 -11,-1.5 ccw(c-11,-2.5) -12,-2.5 -12,-11 ; -12,2.5 ccw(c-11,2.5) -11,1.5 -4,1.5 ccw(c-4,2.5) -3,2.5 -3,11 ccw(c-4,11) -4,12 -11,12 ccw(c-11,11) -12,11 -12,2.5 ; 3,-11 ccw(c4,-11) 4,-12 11,-12 ccw(c11,-11) 12,-11 12,-2.5 ccw(c11,-2.5) 11,-1.5 4,-1.5 ccw(c4,-2.5) 3,-2.5 3,-11 ; 3,2.5 ccw(c4,2.5) 4,1.5 11,1.5 ccw(c11,2.5) 12,2.5 12,11 ccw(c11,11) 11,12 4,12 ccw(c4,11) 3,11 3,2.5
Mechanical 14:
  circle w0.1: c-15,0 r2.15
  lines w0.1: -15.85,-12.725 -15.85,-11.725 ; -15.85,-10.725 -15.85,-9.725 ; -15.85,9.725 -15.85,10.725 ; -15.85,11.725 -15.85,12.725 ; -15.747,-8.725 -15.162,-7.725 ; -15.747,8.725 -15.162,7.725 ; -14.576,-6.725 -13.991,-5.725 ; -14.576,6.725 -13.991,5.725 ; -13.405,-4.725 -12.82,-3.725 ; -13.405,4.725 -12.82,3.725 ; -12.234,-2.725 -11.778,-1.945 ccw(c-15.073,0) -11.657,-1.725 ; -12.234,2.725 -11.778,1.945 cw(c-15.073,0) -11.657,1.725 ; -11.316,-0.725 ccw(c-15.073,0) -11.316,0.725 ; 11.319,-0.725 cw(c15.1,0) 11.319,0.725 ; 11.658,-1.725 ccw(c15.1,0) 11.778,-1.945 12.234,-2.725 ; 11.658,1.725 cw(c15.1,0) 11.778,1.945 12.234,2.725 ; 12.82,-3.725 13.405,-4.725 ; 12.82,3.725 13.405,4.725 ; 13.991,-5.725 14.576,-6.725 ; 13.991,5.725 14.576,6.725 ; 15.162,-7.725 15.748,-8.725 ; 15.162,7.725 15.748,8.725 ; 15.85,-12.725 15.85,-11.725 ; 15.85,-10.725 15.85,-9.725 ; 15.85,9.725 15.85,10.725 ; 15.85,11.725 15.85,12.725 ; -19.025,-10.725 -19.025,10.725 -17.025,12.725 17.025,12.725 19.025,10.725 19.025,2.15 15,2.15 ccw(c15,0) 15,-2.15 19.025,-2.15 19.025,-10.725 17.025,-12.725 -17.025,-12.725 -19.025,-10.725
3D body "VISHAY_SOT-227_flip.stp": height 12.3, standoff 0, extent -19.025,-12.725 19.025,12.725

## VISHAY_WOG [mm] "Bridge Rectifier, Body 9.35m x 8.33mm, VISHAY Case Type WOG"
height 5.6
pads (4):
  round 1.8 hole 1.1: 1(2.54,2.54) 2(2.54,-2.54) 3(-2.54,-2.54) 4(-2.54,2.54)
Top Overlay:
  lines w0.2: -4.165,0.963 cw(c-3.805,0.616) -3.39,0.895 ; -3.365,0.875 ccw(c-2.984,1.198) -2.555,0.941 ; 2.625,-0.772 cw(c2.985,-1.119) 3.4,-0.84 ; 3.425,-0.86 ccw(c3.806,-0.537) 4.235,-0.794 ; -3.003,3.91 ccw(c0,0) 3.003,3.91 -3.003,3.91
  text "+" at -0.1,1.72 h1.8
  text "-" at -1.105,-3.52 h2
Notvisible:
  lines w0.1: -3.04,-2.54 -2.54,-2.54 ; -3.04,2.54 -2.54,2.54 ; -2.54,-3.04 -2.54,-2.54 ; -2.54,-2.04 -2.54,-2.54 ; -2.54,2.04 -2.54,2.54 ; -2.54,3.04 -2.54,2.54 ; -2.04,-2.54 -2.54,-2.54 ; -2.04,2.54 -2.54,2.54 ; -0.5,0 0,0 ; 0,-0.5 0,0 ; 0,0.5 0,0 ; 0.5,0 0,0 ; 2.04,-2.54 2.54,-2.54 ; 2.04,2.54 2.54,2.54 ; 2.54,-3.04 2.54,-2.54 ; 2.54,-2.04 2.54,-2.54 ; 2.54,2.04 2.54,2.54 ; 2.54,3.04 2.54,2.54 ; 3.04,-2.54 2.54,-2.54 ; 3.04,2.54 2.54,2.54
Mechanical 14:
  lines w0.1: -3.003,3.91 ccw(c0,0) 3.003,3.91 -3.003,3.91
  lines w0.2: -4.165,0.963 cw(c-3.805,0.616) -3.39,0.895 ; -3.365,0.875 ccw(c-2.984,1.198) -2.555,0.941 ; 2.625,-0.772 cw(c2.985,-1.119) 3.4,-0.84 ; 3.425,-0.86 ccw(c3.806,-0.537) 4.235,-0.794
  text "+" at -0.1,1.72 h1.8
  text "-" at -1.105,-3.52 h2
3D body "VISHAY_WOG.stp": height 8.6, standoff -3.6, extent -4.888,-4.888 4.888,3.91

## VMI_1N6517 [mm] "DO-201AD, Diode, Axial; Lead Spacing 15.24mm, Lead Dia. 1mm, Body Length 8.89mm, Body Dia. 5.46mm"
height 5.46
pads (2):
  round 2 hole 1.3: 1(-7.62,0) 2(7.62,0)
Top Overlay:
  lines w0.2: -6.333,-0.55 -4.445,-0.55 ; -6.333,0.55 -4.445,0.55 ; -4.145,-0.75 -4.445,-0.75 -4.445,0.75 -4.145,0.75 ; -2.824,-1.891 -2.824,1.891 ; -2.624,-1.991 -2.624,1.991 ; -2.424,-2.091 -2.424,2.091 ; -2.224,-2.191 -2.224,2.191 ; -2.024,-2.291 -2.024,2.291 ; 4.145,-0.75 4.445,-0.75 4.445,0.75 4.145,0.75 ; 4.445,-0.55 6.333,-0.55 ; 4.445,0.55 6.333,0.55 ; -4.145,-0.921 ccw(c-3.645,-0.921) -3.869,-1.368 -1.778,-2.413 ccw(c-0.437,0.27) -0.437,-2.73 0.437,-2.73 ccw(c0.437,0.27) 1.778,-2.413 3.869,-1.368 ccw(c3.645,-0.921) 4.145,-0.921 4.145,0.921 ccw(c3.645,0.921) 3.869,1.368 1.778,2.413 ccw(c0.437,-0.27) 0.437,2.73 -0.437,2.73 ccw(c-0.437,-0.27) -1.778,2.413 -3.869,1.368 ccw(c-3.645,0.921) -4.145,0.921 -4.145,-0.921
Notvisible:
  lines w0.1: -8.12,0 -7.62,0 ; -7.62,-0.5 -7.62,0 ; -7.62,0.5 -7.62,0 ; -7.12,0 -7.62,0 ; -0.5,0 0,0 ; 0,-0.5 0,0 ; 0,0.5 0,0 ; 0.5,0 0,0 ; 7.12,0 7.62,0 ; 7.62,-0.5 7.62,0 ; 7.62,0.5 7.62,0 ; 8.12,0 7.62,0
Mechanical 14:
  lines w0.1: -4.445,-0.55 -7.62,-0.55 cw(c-7.62,0) -7.62,0.55 -4.445,0.55 ; -4.145,-0.75 -4.445,-0.75 -4.445,0.75 -4.145,0.75 ; -2.824,-1.891 -2.824,1.891 ; -2.624,-1.991 -2.624,1.991 ; -2.424,-2.091 -2.424,2.091 ; -2.224,-2.191 -2.224,2.191 ; -2.024,-2.291 -2.024,2.291 ; 4.145,-0.75 4.445,-0.75 4.445,0.75 4.145,0.75 ; 4.445,-0.55 7.62,-0.55 ccw(c7.62,0) 7.62,0.55 4.445,0.55 ; -4.145,-0.921 ccw(c-3.645,-0.921) -3.869,-1.368 -1.778,-2.413 ccw(c-0.437,0.27) -0.437,-2.73 0.437,-2.73 ccw(c0.437,0.27) 1.778,-2.413 3.869,-1.368 ccw(c3.645,-0.921) 4.145,-0.921 4.145,0.921 ccw(c3.645,0.921) 3.869,1.368 1.778,2.413 ccw(c0.437,-0.27) 0.437,2.73 -0.437,2.73 ccw(c-0.437,-0.27) -1.778,2.413 -3.869,1.368 ccw(c-3.645,0.921) -4.145,0.921 -4.145,-0.921
3D body "VMI_1N6517.stp": height 5.46, standoff -3.6, extent -8.17,-2.73 8.17,2.73

## XTAL_ECS_ZTBxxxP [mm] "ZTB Serie Leaded Ceramic Resonator, Body L 7.9 x W 3.6mm H 9.3, Pitch 5mm"
height 9.3
pads (2):
  round 2.1 hole 1.4: 1(-2.5,0) 2(2.5,0)
Top Overlay:
  lines w0.2: -3.95,-1.8 3.95,-1.8 3.95,1.8 -3.95,1.8 -3.95,-1.8
Notvisible:
  lines w0.1: -3,0 -2.5,0 ; -2.5,-0.5 -2.5,0 ; -2.5,0.5 -2.5,0 ; -2,0 -2.5,0 ; -0.5,0 0,0 ; 0,-0.5 0,0 ; 0,0.5 0,0 ; 0.5,0 0,0 ; 2,0 2.5,0 ; 2.5,-0.5 2.5,0 ; 2.5,0.5 2.5,0 ; 3,0 2.5,0
Mechanical 14:
  lines w0.1: -3.95,-1.8 -3.95,1.8 3.95,1.8 3.95,-1.8 -3.95,-1.8
3D body "XTAL_ECS_ZTBxxxP.stp": height 9.3, standoff -3.6, extent -3.95,-1.8 3.95,1.8

## XTAL_HC-49/U [mm] "HC-49/U Leaded Cristal, Body 11.05x4.8mm; Pitch 4.88mm"
height 13.6
pads (2):
  round 1.4 hole 0.7: 1(-2.44,0) 2(2.44,0)
Top Overlay:
  lines w0.2: -5.75,0 ccw(c-3.42,0) -3.42,-2.33 3.42,-2.33 ccw(c3.42,0) 5.75,0 ccw(c3.42,0) 3.42,2.33 -3.42,2.33 ccw(c-3.42,0) -5.75,0 ; -5.25,0 ccw(c-3.42,0) -3.42,-1.83 3.42,-1.83 ccw(c3.42,0) 5.25,0 ccw(c3.42,0) 3.42,1.83 -3.42,1.83 ccw(c-3.42,0) -5.25,0
Notvisible:
  lines w0.1: -2.94,0 -2.44,0 ; -2.44,-0.5 -2.44,0 ; -2.44,0.5 -2.44,0 ; -1.94,0 -2.44,0 ; -0.5,0 0,0 ; 0,-0.5 0,0 ; 0,0.5 0,0 ; 0.5,0 0,0 ; 1.94,0 2.44,0 ; 2.44,-0.5 2.44,0 ; 2.44,0.5 2.44,0 ; 2.94,0 2.44,0
Mechanical 14:
  lines w0.1: -5.75,0 ccw(c-3.42,0) -3.42,-2.33 3.42,-2.33 ccw(c3.42,0) 5.75,0 ccw(c3.42,0) 3.42,2.33 -3.42,2.33 ccw(c-3.42,0) -5.75,0 ; -5.25,0 ccw(c-3.42,0) -3.42,-1.83 3.42,-1.83 ccw(c3.42,0) 5.25,0 ccw(c3.42,0) 3.42,1.83 -3.42,1.83 ccw(c-3.42,0) -5.25,0
3D body "XTAL_CITIZEN_HC-49-U-S.stp": height 3.5, standoff -3.6, extent -5.75,-2.33 5.75,2.33

## XTAL_HC-49/U-S [mm] "HC-49/U-S Leaded Cristal, Body 11.5x4.66mm; Pitch 4.88mm"
height 3.5
pads (2):
  round 1.4 hole 0.7: 1(-2.44,0) 2(2.44,0)
Top Overlay:
  lines w0.2: -3.2,-2.325 cw(c-3.2,0) -3.2,2.325 3.2,2.325 cw(c3.2,0) 3.2,-2.325 -3.2,-2.325 ; -3.2,-2.05 cw(c-3.2,0) -3.2,2.05 3.2,2.05 cw(c3.2,0) 3.2,-2.05 -3.2,-2.05
Mechanical 14:
  lines w0.1: -3.2,-2.325 cw(c-3.2,0) -3.2,2.325 3.2,2.325 cw(c3.2,0) 3.2,-2.325 -3.2,-2.325 ; -3.2,-2.05 cw(c-3.2,0) -3.2,2.05 3.2,2.05 cw(c3.2,0) 3.2,-2.05 -3.2,-2.05
3D body "XTAL_HC-49-U.stp": height 13.6, standoff -3.6, extent -5.525,-2.4 5.525,2.4

## ZETEX_E-LINE [mm] "E-Line Case, Pitch 2.54mm, Flat Index, 3 In-Line, Bent Leads, Body 4.57mm x 2.28mm"
height 8.78
pads (3):
  round 1.4 hole 0.9: 1(-2.54,0) 2(0,0) 3(2.54,0)
Top Overlay:
  lines w0.2: -2.385,-1.038 -2.385,-1.205 2.385,-1.205 2.385,-1.038 ; -1.989,0.894 cw(c-1.18,0) -1.18,1.205 1.18,1.205 cw(c1.18,0) 1.989,0.894
Notvisible:
  lines w0.1: -3.04,0 -2.54,0 ; -2.54,-0.5 -2.54,0 ; -2.54,0.5 -2.54,0 ; -2.04,0 -2.54,0 ; -0.5,0 0,0 ; 0,-0.5 0,0 ; 0,0.5 0,0 ; 0.5,0 0,0 ; 2.04,0 2.54,0 ; 2.54,-0.5 2.54,0 ; 2.54,0.5 2.54,0 ; 3.04,0 2.54,0
Mechanical 14:
  lines w0.1: -2.385,-0.225 -2.765,-0.225 -2.765,0.225 -2.364,0.225 ; 2.364,0.225 2.765,0.225 2.765,-0.225 2.385,-0.225 ; -2.385,-1.205 2.385,-1.205 2.385,0 ccw(c1.18,0) 1.18,1.205 -1.18,1.205 ccw(c-1.18,0) -2.385,0 -2.385,-1.205
3D body "ZETEX_E-LINE.stp": height 8.01, standoff -3.2, extent -2.765,-1.205 2.765,1.205